# Altium footprint library Component.PcbLib: 115 footprints (part 8 of 8)
Each footprint in its own frame and in the unit in brackets; x right, y up, seen from the top. Pads: shape width x height; smd on the part's side, far side on the other; paste and mask are expansions set on the pad; w line width, h text height; cw(c..) or ccw(c..) is an arc to the next point about the centre after c.
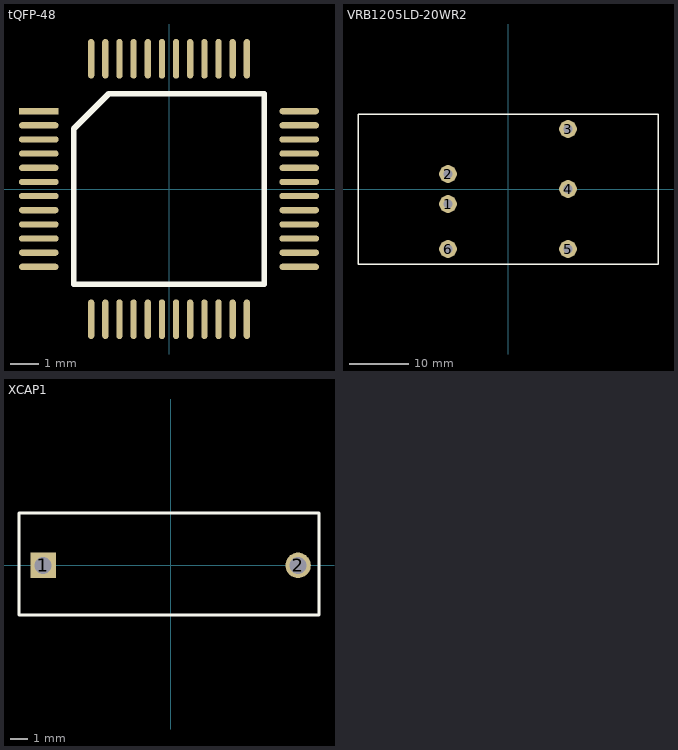
[diagram p7: the footprints below, top view; thin cyan lines are the x and y axes]

## tQFP-48 [mm]
height 1.99
pads (48):
  rect 1.4x0.22 smd: 1(-4.6,2.75)
  oval 1.4x0.22 smd: 2(-4.6,2.25) 3(-4.6,1.75) 4(-4.6,1.25) 5(-4.6,0.75) 6(-4.6,0.25) 7(-4.6,-0.25) 8(-4.6,-0.75) 9(-4.6,-1.25) 10(-4.6,-1.75) 11(-4.6,-2.25) 12(-4.6,-2.75) 25(4.6,-2.75) 26(4.6,-2.25) 27(4.6,-1.75) 28(4.6,-1.25) 29(4.6,-0.75) 30(4.6,-0.25) 31(4.6,0.25) 32(4.6,0.75) 33(4.6,1.25) 34(4.6,1.75) 35(4.6,2.25) 36(4.6,2.75)
  oval 0.22x1.4 smd: 13(-2.75,-4.6) 14(-2.25,-4.6) 15(-1.75,-4.6) 16(-1.25,-4.6) 17(-0.75,-4.6) 18(-0.25,-4.6) 19(0.25,-4.6) 20(0.75,-4.6) 21(1.25,-4.6) 22(1.75,-4.6) 23(2.25,-4.6) 24(2.75,-4.6) 37(2.75,4.6) 38(2.25,4.6) 39(1.75,4.6) 40(1.25,4.6) 41(0.75,4.6) 42(0.25,4.6) 43(-0.25,4.6) 44(-0.75,4.6) 45(-1.25,4.6) 46(-1.75,4.6) 47(-2.25,4.6) 48(-2.75,4.6)
Top Overlay:
  lines w0.2: -3.365,-3.365 3.365,-3.365 3.365,3.365 -2.13,3.365 -3.365,2.13 -3.365,-3.365

## VRB1205LD-20WR2 [mm]
pads (6):
  round 3 hole 1.5: 1(-10.16,-2.54) 2(-10.16,2.54) 3(10.16,10.16) 4(10.16,0) 5(10.16,-10.16) 6(-10.16,-10.16)
Top Overlay:
  lines w0.254: -25.4,-12.7 -25.4,12.7 25.4,12.7 25.4,-12.7 -25.4,-12.7
Bottom Overlay:
  text "GND" at -12.446,-3.302 h1.52
  text "VIN" at -12.7,1.905 h1.52
  text "CTRL" at -12.446,-11.049 h1.52
  text "+VO" at 16.637,9.652 h1.52
  text "TRIM" at 17.907,-0.889 h1.52
  text "0V" at 15.367,-11.049 h1.52
3D body: height 11.8, standoff 1, extent -25.32,-12.8 25.42,12.67

## XCAP1 [mm] "pin 15mm,body 16mm X 6mm"
height 12
pads (2):
  rect 1.5x1.5 hole 1: 1(-7.495,0)
  round 1.5 hole 1: 2(7.495,0)
Top Overlay:
  lines w0.2: -8.915,-2.92 -8.915,3.08 8.725,3.08 8.725,-2.92 -8.915,-2.92
3D body: height 12, standoff 0, extent -8.78,-2.8 8.68,2.94